# Altium footprint library CPU_v1.PcbLib: 56 footprints (part 2 of 4)
Each footprint in its own frame and in the unit in brackets; x right, y up, seen from the top. Pads: shape width x height; smd on the part's side, far side on the other; paste and mask are expansions set on the pad; w line width, h text height; cw(c..) or ccw(c..) is an arc to the next point about the centre after c.
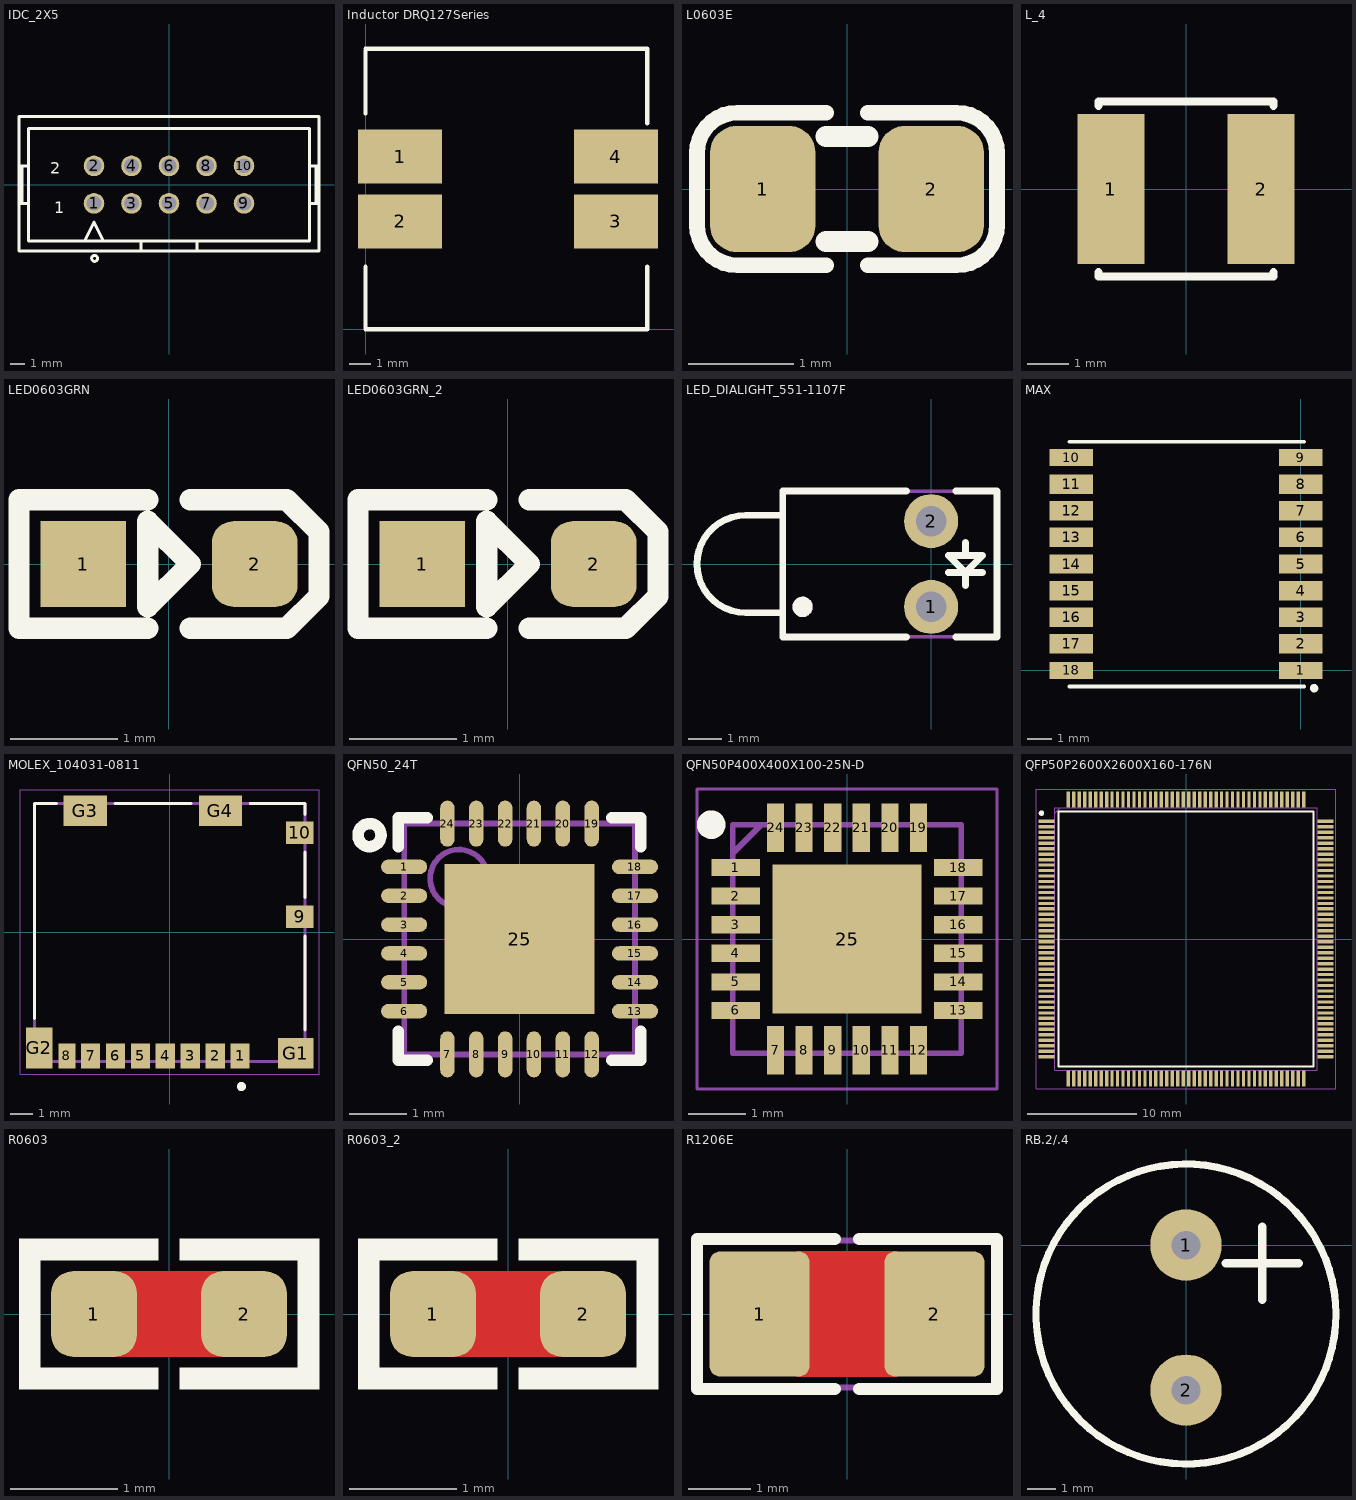
[diagram p1: the footprints below, top view; thin cyan lines are the x and y axes]

## IDC_2X5 [mm] "IDC, HEADER BOX 2X5, 10p, 2.54mm pitch"
height 11.6
pads (10):
  round 1.4 / inner round 1.4 / far side oval 1.4x2.2 hole 1 mask+0.1: 1(-5.08,-1.27) 2(-5.08,1.27) 3(-2.54,-1.27) 4(-2.54,1.27) 5(0,-1.27) 6(0,1.27) 7(2.54,-1.27) 8(2.54,1.27) 9(5.08,-1.27) 10(5.08,1.27)
Top Overlay:
  circle w0.2: c-5.04,-5 r0.2
  lines w0.2: -10.16,-1.27 -9.525,-1.27 ; -10.16,1.27 -9.525,1.27 ; -9.948,-1.27 -9.948,1.27 ; -5.715,-3.81 -5.08,-2.54 -4.445,-3.81 ; -1.905,-4.445 -1.905,-3.81 ; 1.905,-4.445 1.905,-3.81 ; 9.525,-1.27 10.16,-1.27 ; 9.525,1.27 10.16,1.27 ; 9.948,-1.27 9.948,1.27 ; -1.905,-3.81 -9.525,-3.81 -9.525,3.81 9.525,3.81 9.525,-3.81 1.905,-3.81 ; -1.905,-3.81 1.905,-3.81 ; -10.16,-4.5 -10.16,4.6 10.16,4.6 10.16,-4.5 -10.16,-4.5
  text "1" at -7.772,-1.93 h0.8
  text "2" at -8.052,0.737 h0.8
3D body "61201021621.stp": height 9.13, standoff -2.98, extent -10.18,-4.425 10.18,4.75

## Inductor DRQ127Series [mm]
height 11.6
pads (4):
  rect 3.9x2.5 smd: 1(1.6,8) 2(1.6,5) 3(11.6,5) 4(11.6,8)
Top Overlay:
  lines w0.2: 0,2.9 0,0 13.05,0 13.05,2.9 ; 0,10 0,12.9 ; 0,13 13.05,13 13.05,9.55
3D body "DRQ127_12.5x12.5.STEP": height 8.01, standoff 0.01, extent 0.3,0.25 12.8,12.75

## L0603E [mm] "INDUCTOR, FERRITE BEAD, 0603, 1.6X0.8mm, EXPANDED PAD"
height 0.6
pads (2):
  rrect50% 1x1.2 smd mask+0.05: 1(-0.8,0) 2(0.8,0)
Top Overlay:
  lines w0.15: -0.2,-0.725 -1.042,-0.725 cw(c-1.042,-0.342) -1.425,-0.342 -1.425,0.342 cw(c-1.042,0.342) -1.042,0.725 -0.2,0.725 ; 0.2,-0.725 1.042,-0.725 ccw(c1.042,-0.342) 1.425,-0.342 1.425,0.342 ccw(c1.042,0.342) 1.042,0.725 0.2,0.725
  lines w0.2: -0.2,-0.5 0.2,-0.5 ; -0.2,0.5 0.2,0.5
3D body "User Library-Chip Inductor0603.step": height 0.95, standoff 0, extent -0.8,-0.4 0.8,0.4

## L_4 [mm] "INDUCTOR, 3.8x3.8mm, 3.7x3.5mm, WURTH 744031470"
height 1.7
pads (2):
  rect 1.6x3.6 smd paste-0.2: 1(-1.8,0) 2(1.8,0)
Top Overlay:
  lines w0.2: -2.1,-2 -2.1,-2.1 2.1,-2.1 2.1,-2 ; -2.1,2 -2.1,2.1 2.1,2.1 2.1,2
3D body: height 1.7, standoff 0, extent -2,-2 2,2

## LED0603GRN [mm] "LED SMD 0603, GREEN"
height 2.25
pads (2):
  rect 0.8x0.8 smd paste-5 mask+0.075: 1(-0.8,0)
  rrect50% 0.8x0.8 smd paste-5 mask+0.075: 2(0.8,0)
Top Overlay:
  lines w0.2: -0.2,-0.6 -1.4,-0.6 -1.4,0.6 -0.2,0.6 ; 0.2,-0.6 1.1,-0.6 1.4,-0.3 1.4,0.3 1.1,0.6 0.2,0.6 ; -0.2,-0.4 -0.2,0.4 0.2,0 -0.2,-0.4
Top Paste:
  region: -0.75,0.35 -0.68,0.35 -0.552,0.297 -0.453,0.198 -0.4,0.07 -0.4,0 -0.4,-0.07 -0.453,-0.198 -0.552,-0.297 -0.68,-0.35 -0.75,-0.35 -0.95,-0.35 -0.98,-0.35 -1.035,-0.327 -1.077,-0.285 -1.1,-0.23 -1.1,-0.2 -1.1,0.2 -1.1,0.23 -1.077,0.285 -1.035,0.327 -0.98,0.35 -0.95,0.35
  region: 0.75,0.35 0.68,0.35 0.552,0.297 0.453,0.198 0.4,0.07 0.4,0 0.4,-0.07 0.453,-0.198 0.552,-0.297 0.68,-0.35 0.75,-0.35 0.95,-0.35 0.98,-0.35 1.035,-0.327 1.077,-0.285 1.1,-0.23 1.1,-0.2 1.1,0.2 1.1,0.23 1.077,0.285 1.035,0.327 0.98,0.35 0.95,0.35
3D body: height 0.5, standoff 0, extent -0.4,-0.3 0.4,0.3
3D body: height 0.4, standoff 0, extent -0.6,-0.4 0.6,0.4
3D body: height 0.4, standoff 0, extent -0.8,-0.4 -0.6,0.4
3D body: height 0.4, standoff 0, extent 0.6,-0.4 0.8,0.4

## LED0603GRN_2 [mm]
pads (2):
  rect 0.8x0.8 smd paste-5 mask+0.075: 1(-0.8,0)
  rrect50% 0.8x0.8 smd paste-5 mask+0.075: 2(0.8,0)
Top Overlay:
  lines w0.2: -0.2,-0.6 -1.4,-0.6 -1.4,0.6 -0.2,0.6 ; 0.2,-0.6 1.1,-0.6 1.4,-0.3 1.4,0.3 1.1,0.6 0.2,0.6 ; -0.2,-0.4 0.2,0 -0.2,0.4 -0.2,-0.4
Top Paste:
  region: 0.75,0.35 0.68,0.35 0.552,0.297 0.453,0.198 0.4,0.07 0.4,0 0.4,-0.07 0.453,-0.198 0.552,-0.297 0.68,-0.35 0.75,-0.35 0.95,-0.35 0.98,-0.35 1.035,-0.327 1.077,-0.285 1.1,-0.23 1.1,-0.2 1.1,0.2 1.1,0.23 1.077,0.285 1.035,0.327 0.98,0.35 0.95,0.35
  region: -0.75,0.35 -0.68,0.35 -0.552,0.297 -0.453,0.198 -0.4,0.07 -0.4,0 -0.4,-0.07 -0.453,-0.198 -0.552,-0.297 -0.68,-0.35 -0.75,-0.35 -0.95,-0.35 -0.98,-0.35 -1.035,-0.327 -1.077,-0.285 -1.1,-0.23 -1.1,-0.2 -1.1,0.2 -1.1,0.23 -1.077,0.285 -1.035,0.327 -0.98,0.35 -0.95,0.35
3D body: height 0.5, standoff 0, extent -0.4,-0.3 0.4,0.3
3D body: height 0.4, standoff 0, extent -0.6,-0.4 0.6,0.4
3D body: height 0.4, standoff 0, extent -0.8,-0.4 -0.6,0.4
3D body: height 0.4, standoff 0, extent 0.6,-0.4 0.8,0.4

## LED_DIALIGHT_551-1107F [mm] "Single 3mm Red LED, Body 6.35x4.32mm, Pin spacing 2.54mm"
height 7.11
pads (2):
  round 1.6 hole 0.9: 1(0,-1.27) 2(0,1.27)
Top Overlay:
  circle w0.3: c-3.81,-1.27 r0.15
  lines w0.2: -4.4,-1.445 -5.495,-1.445 cw(c-5.495,0) -5.495,1.445 -4.4,1.445 ; -0.728,-2.16 -4.4,-2.16 -4.4,2.16 -0.728,2.16 ; 0.508,-0.254 1.524,-0.254 ; 0.728,-2.16 1.95,-2.16 1.95,2.16 0.728,2.16 ; 1.016,-0.635 1.016,-0.254 ; 1.016,0.254 1.016,0.635 ; 1.016,-0.254 1.524,0.254 0.508,0.254 1.016,-0.254
Mechanical 8:
  lines w0.1: -0.5,-1.27 0,-1.27 ; -0.5,1.27 0,1.27 ; 0,-1.77 0,-1.27 ; 0,-0.77 0,-1.27 ; 0,0.77 0,1.27 ; 0,1.77 0,1.27 ; 0.5,-1.27 0,-1.27 ; 0.5,1.27 0,1.27
Mechanical 14:
  circle w0.3: c-3.81,-1.27 r0.15
  lines w0.1: -4.4,-1.445 -5.495,-1.445 cw(c-5.495,0) -5.495,1.445 -4.4,1.445 ; 1.016,-0.635 1.016,-0.254 ; 1.016,0.254 1.016,0.635 ; 0.508,-0.254 1.524,-0.254 ; 0.508,-0.254 1.524,-0.254 ; 0.508,-0.254 1.524,-0.254 ; 0.508,0.254 1.524,0.254 ; 0.508,0.254 1.016,-0.254 ; 0.508,0.254 1.016,-0.254 ; 0.508,0.254 1.524,0.254 ; 0.508,0.254 1.524,0.254 ; 0.508,0.254 1.016,-0.254 ; 1.016,-0.254 1.524,0.254 ; 1.016,-0.254 1.524,0.254 ; 1.016,-0.254 1.524,0.254 ; -4.4,-2.16 1.95,-2.16 1.95,2.16 -4.4,2.16 -4.4,-2.16
3D body "LED_DIALIGHT_551-1107F.stp": height 7.11, standoff -3.68, extent -6.94,-2.16 1.95,2.16

## MAX [mm]
height 2.25
pads (18):
  rect 1.8x0.7 smd paste-0.1: 1(0,0) 9(0,8.8) 10(-9.5,8.8) 18(-9.5,0)
  rect 1.8x0.8 smd paste-0.1: 2(0,1.1) 3(0,2.2) 4(0,3.3) 5(0,4.4) 6(0,5.5) 7(0,6.6) 8(0,7.7) 11(-9.5,7.7) 12(-9.5,6.6) 13(-9.5,5.5) 14(-9.5,4.4) 15(-9.5,3.3) 16(-9.5,2.2) 17(-9.5,1.1)
Top Overlay:
  lines w0.16: -9.576,-0.667 0.12,-0.667 ; -9.576,9.455 0.127,9.455
  lines w0.2: 0.616,-0.712 ccw(c0.545,-0.733) 0.619,-0.74
Top Paste:
  region: -10.95,9.15 -10.95,8.45 -9.55,8.45 -9.55,8.55 -8.65,8.55 -8.65,9.05 -9.55,9.05 -9.55,9.15
  region: 1.45,8.45 1.45,9.15 0.05,9.15 0.05,9.05 -0.85,9.05 -0.85,8.55 0.05,8.55 0.05,8.45
  region: 1.45,-0.35 1.45,0.35 0.05,0.35 0.05,0.25 -0.85,0.25 -0.85,-0.25 0.05,-0.25 0.05,-0.35
  region: -10.95,0.35 -10.95,-0.35 -9.55,-0.35 -9.55,-0.25 -8.65,-0.25 -8.65,0.25 -9.55,0.25 -9.55,0.35
  region: -10.95,8.1 -10.95,7.3 -9.55,7.3 -9.55,7.4 -8.65,7.4 -8.65,8 -9.55,8 -9.55,8.1
  region: -10.95,7 -10.95,6.2 -9.55,6.2 -9.55,6.3 -8.65,6.3 -8.65,6.9 -9.55,6.9 -9.55,7
  region: -10.95,5.9 -10.95,5.1 -9.55,5.1 -9.55,5.2 -8.65,5.2 -8.65,5.8 -9.55,5.8 -9.55,5.9
  region: -10.95,4.8 -10.95,4 -9.55,4 -9.55,4.1 -8.65,4.1 -8.65,4.7 -9.55,4.7 -9.55,4.8
  region: -10.95,3.7 -10.95,2.9 -9.55,2.9 -9.55,3 -8.65,3 -8.65,3.6 -9.55,3.6 -9.55,3.7
  region: -10.95,2.6 -10.95,1.8 -9.55,1.8 -9.55,1.9 -8.65,1.9 -8.65,2.5 -9.55,2.5 -9.55,2.6
  region: -10.95,1.5 -10.95,0.7 -9.55,0.7 -9.55,0.8 -8.65,0.8 -8.65,1.4 -9.55,1.4 -9.55,1.5
  region: 1.45,0.7 1.45,1.5 0.05,1.5 0.05,1.4 -0.85,1.4 -0.85,0.8 0.05,0.8 0.05,0.7
  region: 1.45,1.8 1.45,2.6 0.05,2.6 0.05,2.5 -0.85,2.5 -0.85,1.9 0.05,1.9 0.05,1.8
  region: 1.45,2.9 1.45,3.7 0.05,3.7 0.05,3.6 -0.85,3.6 -0.85,3 0.05,3 0.05,2.9
  region: 1.45,4 1.45,4.8 0.05,4.8 0.05,4.7 -0.85,4.7 -0.85,4.1 0.05,4.1 0.05,4
  region: 1.45,5.1 1.45,5.9 0.05,5.9 0.05,5.8 -0.85,5.8 -0.85,5.2 0.05,5.2 0.05,5.1
  region: 1.45,6.2 1.45,7 0.05,7 0.05,6.9 -0.85,6.9 -0.85,6.3 0.05,6.3 0.05,6.2
  region: 1.45,7.3 1.45,8.1 0.05,8.1 0.05,8 -0.85,8 -0.85,7.4 0.05,7.4 0.05,7.3
3D body "MAX (STEP-AP214).STEP": height 2.47, standoff 0, extent -9.576,-0.65 0.124,9.45

## MOLEX_104031-0811 [mm]
height 1.57
pads (14):
  rect 0.85x1.1 smd: 1(3.105,-5.45) 2(2.005,-5.45) 3(0.905,-5.45) 4(-0.195,-5.45) 5(-1.295,-5.45) 6(-2.395,-5.45) 7(-3.495,-5.45)
  rect 0.75x1.1 smd: 8(-4.545,-5.45)
  rect 1.2x1 smd: 9(5.74,0.7) 10(5.74,4.4)
  rect 1.55x1.35 smd: G1(5.565,-5.325)
  rect 1.17x1.8 smd: G2(-5.755,-5.1)
  rect 1.9x1.35 smd: G3(-3.73,5.375) G4(2.24,5.375)
Top Overlay:
  circle w0.2: c3.168,-6.801 r0.1
  lines w0.127: -5.975,-3.806 -5.975,5.7 -5.003,5.7 ; -2.413,5.7 0.939,5.7 ; 3.556,5.7 5.975,5.7 5.975,5.211 ; 5.975,-4.3 5.975,-0.15 ; 5.975,1.55 5.975,3.55
Mechanical 13:
  circle w0.2: c3.168,-6.801 r0.1
  lines w0.127: -5.975,-5.7 -5.975,5.7 5.975,5.7 5.975,-5.7 -5.975,-5.7
Mechanical 15:
  lines w0.05: -6.59,-6.25 -6.59,6.3 6.59,6.3 6.59,-6.25 -6.59,-6.25
3D body "1040310811.stp": height 1.42, standoff -0.03, extent -6,-5.636 5.951,5.764
3D body "User Library-Micro_SD.step": height 1.15, standoff 0.17, extent -5.486,-9.453 5.514,5.547

## QFN50_24T [mm] "RTW, RGE S-PQFP-N24 (TI), HVQFN24, 4X4mm, 0.5mm, MO-220 (JEDEC)"
height 1
pads (25):
  oval 0.8x0.25 smd mask+0.05: 1(-2,1.25) 2(-2,0.75) 3(-2,0.25) 4(-2,-0.25) 5(-2,-0.75) 6(-2,-1.25) 13(2,-1.25) 14(2,-0.75) 15(2,-0.25) 16(2,0.25) 17(2,0.75) 18(2,1.25)
  oval 0.25x0.8 smd mask+0.05: 7(-1.25,-2) 8(-0.75,-2) 9(-0.25,-2) 10(0.25,-2) 11(0.75,-2) 12(1.25,-2) 19(1.25,2) 20(0.75,2) 21(0.25,2) 22(-0.25,2) 23(-0.75,2) 24(-1.25,2)
  rect 2.6x2.6 smd paste-2 mask+0.05: 25(0,0)
Top Overlay:
  circle w0.2: c-2.6,1.8 r0.2
  lines w0.2: -2.1,-1.6 -2.1,-2.1 -1.6,-2.1 ; -2.1,1.6 -2.1,2.1 -1.6,2.1 ; 1.6,-2.1 2.1,-2.1 2.1,-1.6 ; 1.6,2.1 2.1,2.1 2.1,1.6
Top Paste:
  rectangle: -1.1,0.2 -0.2,1.1
  region: 1.1,1.1 0.2,1.1 0.2,0.2 1.1,0.2
  region: 1.1,-0.2 0.2,-0.2 0.2,-1.1 1.1,-1.1
  rectangle: -1.1,-1.1 -0.2,-0.2
Mechanical 13:
  circle w0.1: c-1.05,1.05 r0.5
  lines w0.1: -2,-2 2,-2 2,2 -2,2 -2,-2
3D body "RTW0024H.stp": height 0.8, standoff 0, extent -2,-2 2,2

## QFN50P400X400X100-25N-D [mm]
pads (25):
  rect 0.85x0.3 smd: 1(-1.95,1.25) 2(-1.95,0.75) 3(-1.95,0.25) 4(-1.95,-0.25) 5(-1.95,-0.75) 6(-1.95,-1.25) 13(1.95,-1.25) 14(1.95,-0.75) 15(1.95,-0.25) 16(1.95,0.25) 17(1.95,0.75) 18(1.95,1.25)
  rect 0.3x0.85 smd: 7(-1.25,-1.95) 8(-0.75,-1.95) 9(-0.25,-1.95) 10(0.25,-1.95) 11(0.75,-1.95) 12(1.25,-1.95) 19(1.25,1.95) 20(0.75,1.95) 21(0.25,1.95) 22(-0.25,1.95) 23(-0.75,1.95) 24(-1.25,1.95)
  rect 2.6x2.6 smd: 25(0,0)
Top Overlay:
  circle w0.25: c-2.375,2 r0.125
Mechanical 13:
  lines w0.1: -2,1.5 -1.5,2 ; -2,-2 2,-2 2,2 -2,2 -2,-2
Mechanical 15:
  lines w0.05: -2.625,-2.625 2.625,-2.625 2.625,2.625 -2.625,2.625 -2.625,-2.625
3D body "LAN8742A-CZ-TR.stp": height 1, standoff 0, extent -2.05,-2.05 2.05,2.05

## QFP50P2600X2600X160-176N [mm]
height 13.1
pads (176):
  rect 1.45x0.3 smd: 1(-12.725,10.75) 2(-12.725,10.25) 3(-12.725,9.75) 4(-12.725,9.25) 5(-12.725,8.75) 6(-12.725,8.25) 7(-12.725,7.75) 8(-12.725,7.25) 9(-12.725,6.75) 10(-12.725,6.25) 11(-12.725,5.75) 12(-12.725,5.25) 13(-12.725,4.75) 14(-12.725,4.25) 15(-12.725,3.75) 16(-12.725,3.25) 17(-12.725,2.75) 18(-12.725,2.25) 19(-12.725,1.75) 20(-12.725,1.25) 21(-12.725,0.75) 22(-12.725,0.25) 23(-12.725,-0.25) 24(-12.725,-0.75) 25(-12.725,-1.25) 26(-12.725,-1.75) 27(-12.725,-2.25) 28(-12.725,-2.75) 29(-12.725,-3.25) 30(-12.725,-3.75) 31(-12.725,-4.25) 32(-12.725,-4.75) 33(-12.725,-5.25) 34(-12.725,-5.75) 35(-12.725,-6.25) 36(-12.725,-6.75) 37(-12.725,-7.25) 38(-12.725,-7.75) 39(-12.725,-8.25) 40(-12.725,-8.75) 41(-12.725,-9.25) 42(-12.725,-9.75) 43(-12.725,-10.25) 44(-12.725,-10.75) 89(12.725,-10.75) 90(12.725,-10.25) 91(12.725,-9.75) 92(12.725,-9.25) 93(12.725,-8.75) 94(12.725,-8.25) 95(12.725,-7.75) 96(12.725,-7.25) 97(12.725,-6.75) 98(12.725,-6.25) 99(12.725,-5.75) 100(12.725,-5.25) 101(12.725,-4.75) 102(12.725,-4.25) 103(12.725,-3.75) 104(12.725,-3.25) 105(12.725,-2.75) 106(12.725,-2.25) 107(12.725,-1.75) 108(12.725,-1.25) 109(12.725,-0.75) 110(12.725,-0.25) 111(12.725,0.25) 112(12.725,0.75) 113(12.725,1.25) 114(12.725,1.75) 115(12.725,2.25) 116(12.725,2.75) 117(12.725,3.25) 118(12.725,3.75) 119(12.725,4.25) 120(12.725,4.75) 121(12.725,5.25) 122(12.725,5.75) 123(12.725,6.25) 124(12.725,6.75) 125(12.725,7.25) 126(12.725,7.75) 127(12.725,8.25) 128(12.725,8.75) 129(12.725,9.25) 130(12.725,9.75) 131(12.725,10.25) 132(12.725,10.75)
  rect 0.3x1.45 smd: 45(-10.75,-12.725) 46(-10.25,-12.725) 47(-9.75,-12.725) 48(-9.25,-12.725) 49(-8.75,-12.725) 50(-8.25,-12.725) 51(-7.75,-12.725) 52(-7.25,-12.725) 53(-6.75,-12.725) 54(-6.25,-12.725) 55(-5.75,-12.725) 56(-5.25,-12.725) 57(-4.75,-12.725) 58(-4.25,-12.725) 59(-3.75,-12.725) 60(-3.25,-12.725) 61(-2.75,-12.725) 62(-2.25,-12.725) 63(-1.75,-12.725) 64(-1.25,-12.725) 65(-0.75,-12.725) 66(-0.25,-12.725) 67(0.25,-12.725) 68(0.75,-12.725) 69(1.25,-12.725) 70(1.75,-12.725) 71(2.25,-12.725) 72(2.75,-12.725) 73(3.25,-12.725) 74(3.75,-12.725) 75(4.25,-12.725) 76(4.75,-12.725) 77(5.25,-12.725) 78(5.75,-12.725) 79(6.25,-12.725) 80(6.75,-12.725) 81(7.25,-12.725) 82(7.75,-12.725) 83(8.25,-12.725) 84(8.75,-12.725) 85(9.25,-12.725) 86(9.75,-12.725) 87(10.25,-12.725) 88(10.75,-12.725) 133(10.75,12.725) 134(10.25,12.725) 135(9.75,12.725) 136(9.25,12.725) 137(8.75,12.725) 138(8.25,12.725) 139(7.75,12.725) 140(7.25,12.725) 141(6.75,12.725) 142(6.25,12.725) 143(5.75,12.725) 144(5.25,12.725) 145(4.75,12.725) 146(4.25,12.725) 147(3.75,12.725) 148(3.25,12.725) 149(2.75,12.725) 150(2.25,12.725) 151(1.75,12.725) 152(1.25,12.725) 153(0.75,12.725) 154(0.25,12.725) 155(-0.25,12.725) 156(-0.75,12.725) 157(-1.25,12.725) 158(-1.75,12.725) 159(-2.25,12.725) 160(-2.75,12.725) 161(-3.25,12.725) 162(-3.75,12.725) 163(-4.25,12.725) 164(-4.75,12.725) 165(-5.25,12.725) 166(-5.75,12.725) 167(-6.25,12.725) 168(-6.75,12.725) 169(-7.25,12.725) 170(-7.75,12.725) 171(-8.25,12.725) 172(-8.75,12.725) 173(-9.25,12.725) 174(-9.75,12.725) 175(-10.25,12.725) 176(-10.75,12.725)
Top Overlay:
  circle w0.25: c-13.2,11.5 r0.125
  lines w0.2: -11.65,-11.65 -11.65,11.65 11.65,11.65 11.65,-11.65 -11.65,-11.65
Mechanical 13:
  lines w0.1: -12,11.5 -11.5,12 ; -12,-12 -12,12 12,12 12,-12 -12,-12
Mechanical 15:
  lines w0.05: -13.7,-13.7 -13.7,13.7 13.7,13.7 13.7,-13.7 -13.7,-13.7
3D body "STM32H743IIT6.stp": height 1.6, standoff 0, extent -13,-13 13,13

## R0603 [mm] "CHIP Resistor 1/10 WATT, 1.6x0.8mm, 0603, OPTIMIZED"
height 0.6
pads (2):
  rrect50% 0.8x0.8 smd paste-5 mask+0.075: 1(-0.7,0) 2(0.7,0)
Top Layer:
  pour cut-out: -0.5,0.4 0.5,0.4 0.5,-0.4 -0.5,-0.4
Top Overlay:
  region: 0.1,-0.5 0.1,-0.7 1.4,-0.7 1.4,-0.5
  region: 0.1,0.5 0.1,0.7 1.4,0.7 1.4,0.5
  region: 1.4,0.7 1.2,0.7 1.2,-0.7 1.4,-0.7
  region: -1.4,0.7 -1.2,0.7 -1.2,-0.7 -1.4,-0.7
  region: -0.1,0.5 -0.1,0.7 -1.4,0.7 -1.4,0.5
  region: -0.1,-0.5 -0.1,-0.7 -1.4,-0.7 -1.4,-0.5
Top Paste:
  region: -0.7,0.35 -0.63,0.35 -0.502,0.297 -0.403,0.198 -0.35,0.07 -0.35,0 -0.35,-0.07 -0.403,-0.198 -0.502,-0.297 -0.63,-0.35 -0.7,-0.35 -0.9,-0.35 -0.93,-0.35 -0.985,-0.327 -1.027,-0.285 -1.05,-0.23 -1.05,-0.2 -1.05,0.2 -1.05,0.23 -1.027,0.285 -0.985,0.327 -0.93,0.35 -0.9,0.35
  region: 0.7,0.35 0.63,0.35 0.502,0.297 0.403,0.198 0.35,0.07 0.35,0 0.35,-0.07 0.403,-0.198 0.502,-0.297 0.63,-0.35 0.7,-0.35 0.9,-0.35 0.93,-0.35 0.985,-0.327 1.027,-0.285 1.05,-0.23 1.05,-0.2 1.05,0.2 1.05,0.23 1.027,0.285 0.985,0.327 0.93,0.35 0.9,0.35
3D body "User Library-RES_1609-0603.step": height 0.56, standoff 0, extent -0.85,-0.4 0.85,0.4

## R0603_2 [mm]
pads (2):
  rrect50% 0.8x0.8 smd paste-5 mask+0.075: 1(-0.7,0) 2(0.7,0)
Top Layer:
  pour cut-out: -0.5,0.4 0.5,0.4 0.5,-0.4 -0.5,-0.4
Top Overlay:
  region: -0.1,-0.5 -0.1,-0.7 -1.4,-0.7 -1.4,-0.5
  region: -0.1,0.5 -0.1,0.7 -1.4,0.7 -1.4,0.5
  region: -1.4,0.7 -1.2,0.7 -1.2,-0.7 -1.4,-0.7
  region: 1.4,0.7 1.2,0.7 1.2,-0.7 1.4,-0.7
  region: 0.1,0.5 0.1,0.7 1.4,0.7 1.4,0.5
  region: 0.1,-0.5 0.1,-0.7 1.4,-0.7 1.4,-0.5
Top Paste:
  region: 0.7,0.35 0.63,0.35 0.502,0.297 0.403,0.198 0.35,0.07 0.35,0 0.35,-0.07 0.403,-0.198 0.502,-0.297 0.63,-0.35 0.7,-0.35 0.9,-0.35 0.93,-0.35 0.985,-0.327 1.027,-0.285 1.05,-0.23 1.05,-0.2 1.05,0.2 1.05,0.23 1.027,0.285 0.985,0.327 0.93,0.35 0.9,0.35
  region: -0.7,0.35 -0.63,0.35 -0.502,0.297 -0.403,0.198 -0.35,0.07 -0.35,0 -0.35,-0.07 -0.403,-0.198 -0.502,-0.297 -0.63,-0.35 -0.7,-0.35 -0.9,-0.35 -0.93,-0.35 -0.985,-0.327 -1.027,-0.285 -1.05,-0.23 -1.05,-0.2 -1.05,0.2 -1.05,0.23 -1.027,0.285 -0.985,0.327 -0.93,0.35 -0.9,0.35
3D body "User Library-RES_1609-0603.step": height 0.56, standoff 0, extent -0.85,-0.4 0.85,0.4

## R1206E [mm] "CHIP RESISTOR 1/4 WATT, EXPANDED PAD"
height 2
pads (2):
  rrect20% 1.6x2 smd mask+0.075: 1(-1.4,0) 2(1.4,0)
Top Layer:
  pour cut-out: -0.8,1 -0.8,-1 0.8,-1 0.8,1
Top Overlay:
  lines w0.2: -0.2,-1.2 -2.4,-1.2 -2.4,1.2 -0.2,1.2 ; 0.2,-1.2 2.4,-1.2 2.4,1.2 0.2,1.2
Mechanical 13:
  lines w0.1: -1.6,-0.8 -1.6,0.8 1.6,0.8 1.6,-0.8 -1.6,-0.8
Mechanical 15:
  lines w0.1: -0.5,0 0.5,0 ; 0,-0.5 0,0.5 ; -2.35,-1.175 -2.35,1.175 2.35,1.175 2.35,-1.175 -2.35,-1.175
3D body "User Library-RES_3216-1206.step": height 0.85, standoff 0, extent -1.675,-0.865 1.675,0.865

## RB.2/.4 [mm]
height 4.3
pads (2):
  round 2.5 hole 1: 1(0,0) 2(0,-5.08)
Top Overlay:
  circle w0.254: c0,-2.413 r5.25
  lines w0.305: 1.397,-0.635 3.937,-0.635 ; 2.667,-1.905 2.667,0.635
3D body "Lib-Capacitor Radial ElectroliticCAPPR500-1000X2000.STEP": height 20.01, standoff -2.7, extent -5,-7.493 5,2.474